# Altium footprint library Library.PcbLib: 298 footprints (part 3 of 19)
Each footprint in its own frame and in the unit in brackets; x right, y up, seen from the top. Pads: shape width x height; smd on the part's side, far side on the other; paste and mask are expansions set on the pad; w line width, h text height; cw(c..) or ccw(c..) is an arc to the next point about the centre after c.
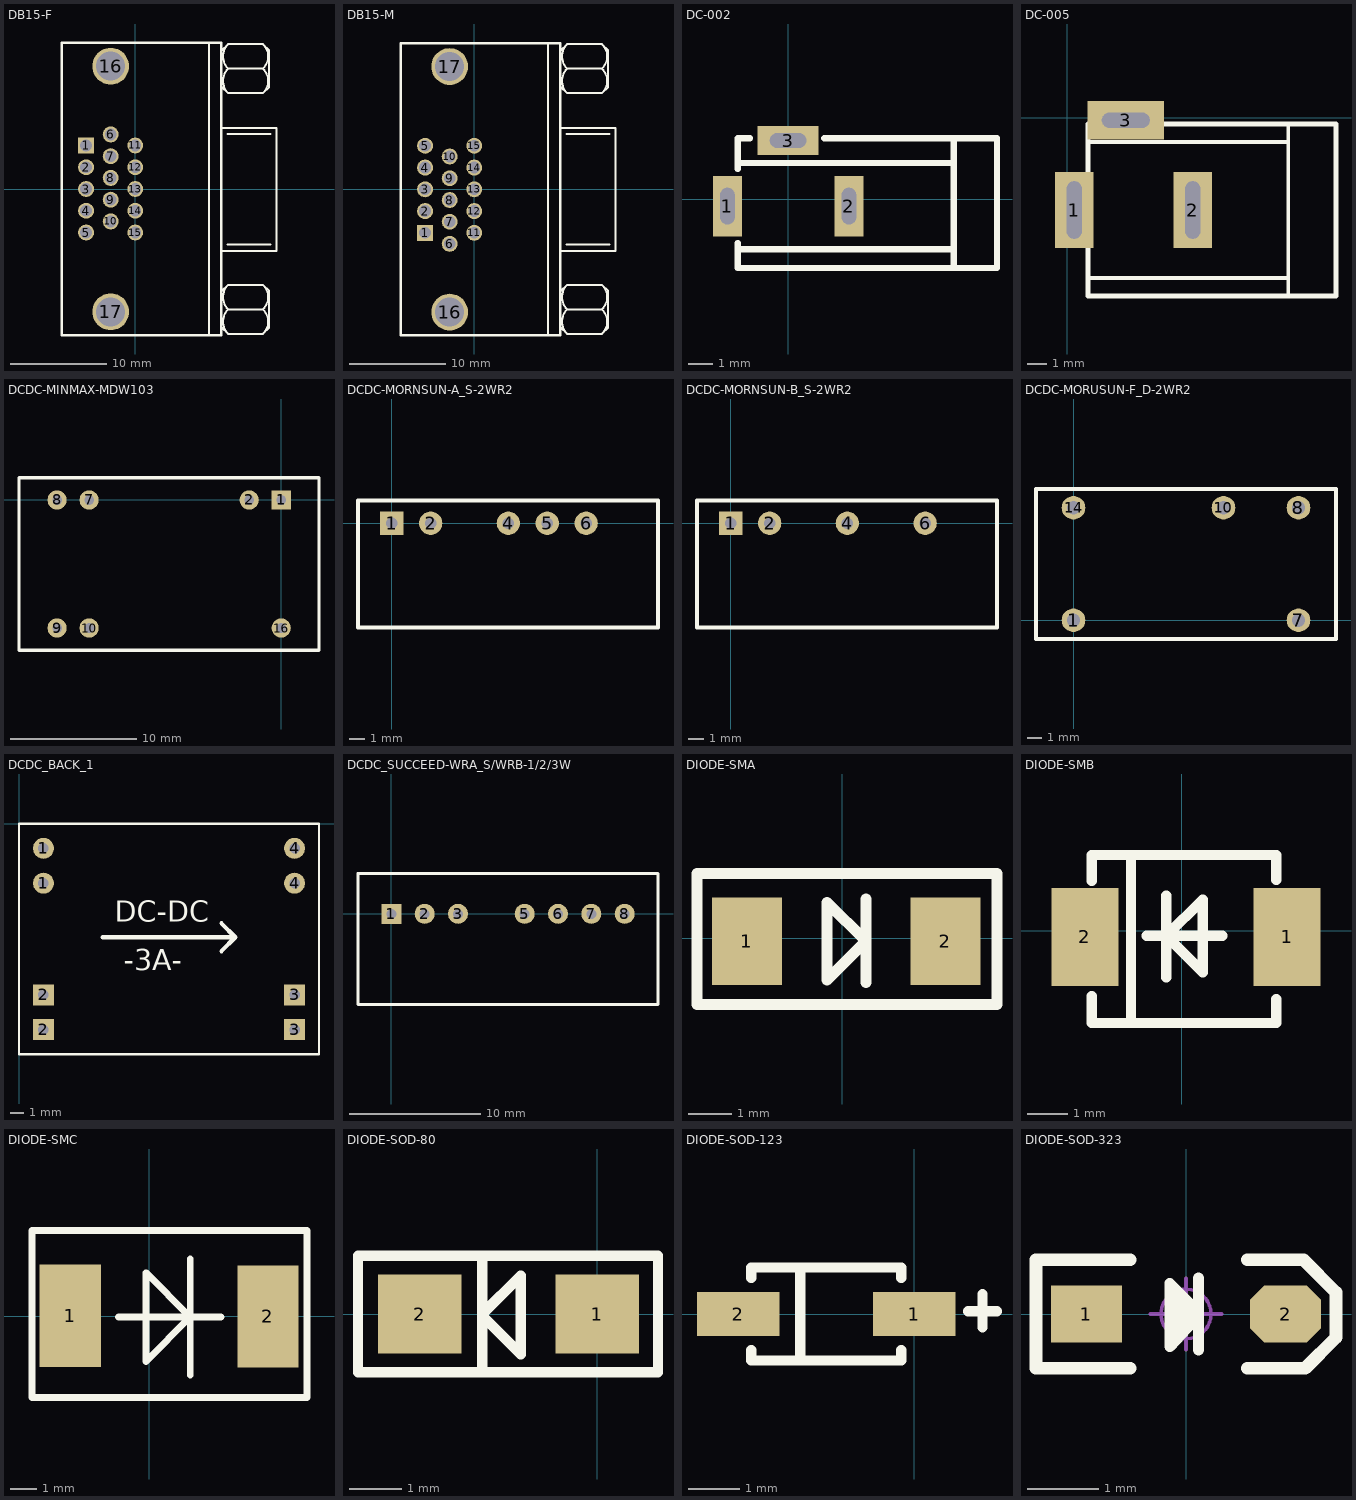
[diagram p2: the footprints below, top view; thin cyan lines are the x and y axes]

## DB15-F [mil] "VGAĸ"
height 393.7
pads (17):
  rect 65x65 hole 48: 1(-200,177.16)
  round 65 hole 48: 2(-200,88.58) 3(-200,0) 4(-200,-88.58) 5(-200,-177.16) 6(-100,222.17) 7(-100,133.58) 8(-100,45) 9(-100,-43.58) 10(-100,-132.16) 11(0,177.16) 12(0,88.58) 13(0,0) 14(0,-88.58) 15(0,-177.16)
  round 150 hole 118.11: 16(-100,500) 17(-100,-500)
Top Overlay:
  lines w8: 300,-595 300,596.25 ; 350,-251.67 575,-251.67 575,248.33 350,248.33 ; 353.33,-565 378.33,-590 520,-590 545,-565 545,-415 520,-390 378.33,-390 353.33,-415 ; 353.33,415 378.33,390 520,390 545,415 545,565 520,590 378.33,590 353.33,565 ; 375,-226.67 550,-226.67 ; 375,223.33 550,223.33 ; 378.25,-590.09 cw(c428.33,-540) 378.25,-489.91 ; 378.25,-490.09 cw(c428.33,-440) 378.25,-389.91 ; 378.25,389.91 cw(c428.33,440) 378.25,490.09 ; 378.25,489.91 cw(c428.33,540) 378.25,590.09 ; 378.33,-490 520,-490 ; 378.33,490 520,490 ; 520.09,-590.09 ccw(c470,-540) 520.09,-489.91 ; 520.09,-490.09 ccw(c470,-440) 520.09,-389.91 ; 520.09,389.91 ccw(c470,440) 520.09,490.09 ; 520.09,489.91 ccw(c470,540) 520.09,590.09
  lines w10: -300,-595 -300,595 350,595 350,-595 -300,-595

## DB15-M [mil] "VGA公"
height 393.7
pads (17):
  rect 65x65 hole 48: 1(-200,-177.16)
  round 65 hole 48: 2(-200,-88.58) 3(-200,0) 4(-200,88.58) 5(-200,177.16) 6(-100,-222) 7(-100,-132.16) 8(-100,-43.58) 9(-100,45) 10(-100,133.58) 11(0,-177.16) 12(0,-88.58) 13(0,0) 14(0,88.58) 15(0,177.16)
  round 150 hole 118.11: 16(-100,-500) 17(-100,500)
Top Overlay:
  lines w8: 300,-596.25 300,595 ; 350,-250.42 575,-250.42 575,249.58 350,249.58 ; 353.33,-563.75 378.33,-588.75 520,-588.75 545,-563.75 545,-413.75 520,-388.75 378.33,-388.75 353.33,-413.75 ; 353.33,416.25 378.33,391.25 520,391.25 545,416.25 545,566.25 520,591.25 378.33,591.25 353.33,566.25 ; 375,-225.42 550,-225.42 ; 375,224.58 550,224.58 ; 378.25,-588.84 cw(c428.33,-538.75) 378.25,-488.66 ; 378.25,-488.84 cw(c428.33,-438.75) 378.25,-388.66 ; 378.25,391.16 cw(c428.33,441.25) 378.25,491.34 ; 378.25,491.16 cw(c428.33,541.25) 378.25,591.34 ; 378.33,-488.75 520,-488.75 ; 378.33,491.25 520,491.25 ; 520.09,-588.84 ccw(c470,-538.75) 520.09,-488.66 ; 520.09,-488.84 ccw(c470,-438.75) 520.09,-388.66 ; 520.09,391.16 ccw(c470,441.25) 520.09,491.34 ; 520.09,491.16 ccw(c470,541.25) 520.09,591.34
  lines w10: -300,-595 350,-595 350,595 -300,595 -300,-595

## DC-002 [mm] "DC母座3.5mm"
height 7.2
pads (3):
  rect 1.2x2.5 hole 0.6 slot 1.5 at 90 deg: 1(-2.511,-0.279) 2(2.489,-0.279)
  rect 2.5x1.2 hole 0.6 slot 1.5 at 0 deg: 3(-0.011,2.421)
Top Overlay:
  lines w0.254: -2.083,-2.057 6.807,-2.057 ; -2.083,-1.803 -2.083,-2.819 8.585,-2.819 8.585,2.515 1.473,2.515 ; -2.083,1.245 -2.083,2.515 -1.575,2.515 ; -2.083,1.499 6.807,1.499 ; 6.807,-2.819 6.807,-2.057 ; 6.807,2.515 6.807,1.499 ; 6.807,-2.057 6.807,1.499
3D body "dc-002.STEP": height 7.3, standoff -3.4, extent -2.811,-2.779 8.489,2.571

## DC-005 [mm] "DC母座5.5mm"
height 12.75
pads (3):
  rect 2x4 hole 0.8 slot 3 at 90 deg: 1(0.353,-4.826) 2(6.553,-4.826)
  rect 4x2 hole 0.8 slot 2.5 at 0 deg: 3(3.053,-0.126)
Top Overlay:
  lines w0.2: 1.069,-8.382 11.553,-8.382 ; 1.069,-1.27 11.553,-1.27 ; 11.553,-9.326 11.553,-0.326
  lines w0.254: 1.069,-9.326 1.069,-0.326 14.053,-0.326 14.053,-9.326 1.069,-9.326
3D body "dc-005.STEP": height 11.2, standoff -3.8, extent 0.003,-9.326 14.053,-0.026

## DCDC-MINMAX-MDW103 [mil]
pads (7):
  rect 60x60 hole 30: 1(0,0)
  round 60 hole 30: 2(-100,0) 7(-600,0) 8(-700,0) 9(-700,-400) 10(-600,-400) 16(0,-400)
Top Overlay:
  lines w10: -818.9,-469.69 118.11,-469.69 118.11,69.69 -818.9,69.69 -818.9,-469.69

## DCDC-MORNSUN-A_S-2WR2 [mil]
pads (5):
  rect 60x60 hole 30: 1(0,0)
  round 60 hole 30: 2(100,0) 4(300,0) 5(400,0) 6(500,0)
Top Overlay:
  lines w10: -87.01,-268 -87.01,58 -42,58 685.04,58 685.04,-268 -42.41,-268 -87.01,-268

## DCDC-MORNSUN-B_S-2WR2 [mil]
pads (4):
  rect 60x60 hole 30: 1(0,0)
  round 60 hole 30: 2(100,0) 4(300,0) 6(500,0)
Top Overlay:
  lines w10: -87.01,-268 -87.01,58 -42,58 685.04,58 685.04,-268 -42.41,-268 -87.01,-268

## DCDC-MORUSUN-F_D-2WR2 [mm]
pads (5):
  round 1.6 hole 0.9: 1(0,0) 7(15.24,0) 8(15.24,7.62) 10(10.16,7.62) 14(0,7.62)
Top Overlay:
  lines w0.254: -2.54,-1.27 -2.54,8.89 17.78,8.89 17.78,-1.27 17.145,-1.27 -0.635,-1.27 -2.54,-1.27

## DCDC_BACK_1 [mil]
pads (8):
  round 60 hole 30: 1(70,-170) 1(70,-70) 4(790,-170) 4(790,-70)
  rect 60x60 hole 30: 2(70,-590) 2(70,-490) 3(790,-590) 3(790,-490)
Top Overlay:
  lines w7.01: 0,-660 860,-660 860,0 0,0 0,-660
  lines w11.81: 240,-325 615,-325 ; 580,-365 620,-325 580,-285
  text "DC-DC" at 275,-280 h60
  text "-3A-" at 300,-420 h60

## DCDC_SUCCEED-WRA_S/WRB-1/2/3W [mil]
pads (7):
  rect 60x60 hole 30: 1(0,0)
  round 60 hole 30: 2(100,0) 3(200,0) 5(400,0) 6(500,0) 7(600,0) 8(700,0)
Top Overlay:
  lines w10: -100,-272 -100,120 -99,121 800,121 800,-272 -100,-272

## DIODE-SMA [mm] "贴片二极管"
height 2.54
pads (2):
  rect 1.6x2 smd: 1(-2.176,-0.072) 2(2.359,-0.072)
Top Overlay:
  lines w0.254: 0.542,-1.012 0.542,0.893 ; -3.319,-1.52 -3.319,1.478 3.539,1.478 3.539,-1.52 -3.319,-1.52 ; -0.347,-0.961 -0.347,0.817 0.542,-0.072 -0.347,-0.961
3D body "DO-214AC.STEP": height 2.4, standoff 0, extent -2.165,-1.396 2.435,1.304

## DIODE-SMB [mm]
height 2.54
pads (2):
  rect 1.65x2.4 smd: 1(2.576,-0.155) 2(-2.374,-0.155)
Top Overlay:
  lines w0.254: -2.211,-1.603 -2.211,-2.263 2.31,-2.263 2.31,-1.679 ; -2.211,1.216 -2.211,1.851 2.31,1.851 2.31,1.242 ; -1.246,-2.187 -1.246,1.851 ; -0.865,-0.13 0.99,-0.13 ; -0.382,-1.146 -0.382,0.861 ; -0.382,-0.13 0.507,0.759 0.507,-1.019 -0.382,-0.13
3D body "DI-214AA(SMB).step": height 2.45, standoff 0.03, extent -2.649,-2.131 2.851,1.769

## DIODE-SMC [mil] "贴片二极管"
height 59.06
pads (2):
  rect 90x149.84 smd: 1(-116.17,1.01)
  rect 90x149.63 smd: 2(173.83,0.01)
Top Overlay:
  lines w10: -45.17,-0.99 104.83,-0.99 ; 59.83,-85.99 59.83,84.01 ; -172.17,-118.99 -172.17,126.01 230.83,126.01 230.83,-118.99 -172.17,-118.99 ; -5.17,-65.99 59.83,-0.99 -5.17,64.01 -5.17,-65.99
3D body "DO-214AB.STEP": height 106.3, standoff 0, extent -131.01,-116.09 188.68,128.01

## DIODE-SOD-80 [mm] "LL34"
pads (2):
  rect 1.6x1.524 smd: 1(0,0) 2(-3.4,0)
Top Overlay:
  lines w0.2: -4.588,1.092 -4.588,-1.118 1.168,-1.118 1.168,1.067 ; -4.588,1.118 1.168,1.118 ; -2.2,-1.118 -2.2,1.118 ; -2.2,-0.035 -2.2,0 -1.463,0.737 -1.463,-0.772 -2.2,-0.035
3D body "SOD-80.STEP": height 1.5, standoff 0, extent -3.528,-0.75 -0.028,0.75

## DIODE-SOD-123 [mm] "1206"
pads (2):
  rect 1.6x0.85 smd: 1(0,0) 2(-3.4,0)
Top Overlay:
  lines w0.2: -3.15,-0.7 -3.15,-0.9 -0.25,-0.9 -0.25,-0.7 ; -3.15,0.7 -3.15,0.9 -0.25,0.9 -0.25,0.7 ; -2.2,-0.9 -2.2,0.9 ; 1.043,0.051 1.602,0.051 ; 1.323,-0.254 1.323,0.381
3D body "User Library-SOD-123_DiodesInc.STEP": height 1.42, standoff -0.03, extent -3.596,-0.853 0.254,0.847

## DIODE-SOD-323 [mm]
pads (2):
  rect 1x0.8 smd: 1(-1.4,0)
  oct 1x0.8 smd: 2(1.4,0)
Top Overlay:
  lines w0.152: 0.178,-0.508 0.178,0.508 ; 0.178,-0.025 -0.229,-0.457 -0.229,0.432 0.178,0.025
  lines w0.178: -0.787,-0.762 -2.108,-0.762 -2.108,0.762 -0.787,0.762 ; 0.864,-0.762 1.676,-0.762 2.108,-0.33 2.108,0.305 1.651,0.762 0.864,0.762
  lines w0.254: -0.127,0.254 -0.152,-0.178 0.025,-0.025 -0.025,0.127
Mechanical 15:
  circle w0.05: c0,0 r0.35
  lines w0.05: -0.5,0 0.5,0 ; 0,-0.5 0,0.5
3D body "SOD-323.STEP": height 1, standoff 0.04, extent -1.337,-0.631 1.311,0.669